# Altium schematic symbol library IC.SchLib: 555 symbols (part 8 of 15) (continued)
## MT47H128M16 (continued)

## MT47H128M16HG-3
designator U?, comment MT47H128M16HG
2Gb Synchronous High-Speed CMOS DRAM, 128Mb x 16Bit x 16 Banks, 84-Ball FPGA, Commercial; Manufacturer: Micron; Manufacturer No: MT47H128M16HG-3:A, MT47H128M16HG-25:A, MT47H128M16RT-25E:C; Sort: 510; Tech: SMDR; Package: BGA84
footprint FBGA84DDR2 (BGA, 84-Leads, Body 14,0x11,5mm,  Pitch 0,80mm)
pins: A1 VDD (power) "Power Supply", A2 NC (in), A3 VSS (power) "Ground", A7 VSSQ (power) "DQ Ground", A8 ~{UDQS} (in) "Data Strobe for DQ8-DQ15", A9 VDDQ (power) "DQ Power", B1 DQ14 (io) "Data Input/Output 14", B2 VSSQ (power) "DQ Ground", B3 UDM (in) "Input/Output Mask for DQ8-DQ15", B7 UDQS (in) "Data Strobe for DQ8-DQ15", B8 VSSQ (power) "DQ Ground", B9 DQ15 (io) "Data Input/Output 15", C1 VDDQ (power) "DQ Power", C2 DQ9 (io) "Data Input/Output 9", C3 VDDQ (power) "DQ Power", C7 VDDQ (power) "DQ Power", C8 DQ8 (io) "Data Input/Output 8", C9 VDDQ (power) "DQ Power", D1 DQ12 (io) "Data Input/Output 12", D2 VSSQ (power) "DQ Ground", D3 DQ11 (io) "Data Input/Output 11", D7 DQ10 (io) "Data Input/Output 10", D8 VSSQ (power) "DQ Ground", D9 DQ13 (io) "Data Input/Output 13", E1 VDD (power) "Power Supply", E2 NC (in), E3 VSS (power) "Ground", E7 VSSQ (power) "DQ Ground", E8 ~{LDQS} (in) "Data Strobe for DQ0-DQ7", E9 VDDQ (power) "DQ Power", F1 DQ6 (io) "Data Input/Output 6", F2 VSSQ (power) "DQ Ground", F3 LDM (in) "Input/Output Mask for DQ0-DQ7", F7 LDQS (in) "Data Strobe for DQ0-DQ7", F8 VSSQ (power) "DQ Ground", F9 DQ7 (io) "Data Input/Output 7", G1 VDDQ (power) "DQ Power", G2 DQ1 (io) "Data Input/Output 1", G3 VDDQ (power) "DQ Power", G7 VDDQ (power) "DQ Power", G8 DQ0 (io) "Data Input/Output 0", G9 VDDQ (power) "DQ Power", H1 DQ4 (io) "Data Input/Output 4", H2 VSSQ (power) "DQ Ground", H3 DQ3 (io) "Data Input/Output 3", H7 DQ2 (io) "Data Input/Output 2", H8 VSSQ (power) "DQ Ground", H9 DQ5 (io) "Data Input/Output 5", J1 VDDL (power) "DL Power", J2 VREF (power) "Vref", J3 VSS (power) "Ground", J7 VSSDL (power) "DL Ground", J8 CK (in) "Clock", J9 VDD (power) "Power Supply", K2 CKE (in) "Clock Enable", K3 ~{WE} (in) "Command Input", K7 ~{RAS} (in) "Command Input", K8 ~{CK} (in) "Clock", K9 ODT (in), L1 BA2 (in), L2 BA0 (in) "Bank Address Input 0", L3 BA1 (in) "Bank Address Input 1", L7 ~{CAS} (in) "Command Input", L8 ~{CS} (in) "Chip Select", M2 A10/AP (in) "Address Input 10", M3 A1 (in) "Address Input 1", M7 A2 (in) "Address Input 2", M8 A0 (in) "Address Input 0", M9 VDD (power) "Power Supply", N1 VSS (power) "Ground", N2 A3 (in) "Address Input 3", N3 A5 (in) "Address Input 5", N7 A6 (in) "Address Input 6", N8 A4 (in) "Address Input 4", P2 A7 (in) "Address Input 7", P3 A9 (in) "Address Input 9", P7 A11 (in) "Address Input 11", P8 A8 (in) "Address Input 8", P9 VSS (power) "Ground", R1 VDD (power) "Power Supply", R2 A12 (in) "Address Input 12", R3 A14 (in), R7 A15 (in), R8 A13 (in)

## NB4N527S
designator U?
3.3V, 2.5Gb/s Dual  AnyLevel to LVDS  Receiver/Driver/Buffer/  Translator with Internal  Input Termination; Manufacturer: OnSemi, Digi-Key; Manufacturer No: NB4N527SMNG, NB4N527SMNGOS-ND; Comment2: +3.3Vcc; Sort: 510; Tech: SMDR; Package: QFN16; Price: 0
footprint QFN16N-2 (QFN, 16-Leads, Body 3,0x3,0mm (max), Pitch 0,50mm, IPC Medium Density)
signal-integrity model Model Name (Model Description)
pins: 1 Vtd1, 2 D1, 3 ~{D1}, 4 ~{Vtd1}, 5 GND, 6 NC, 7 NC, 8 VCC, 9 ~{Q1}, 10 Q1, 11 ~{Q0}, 12 Q0, 13 Vtd0, 14 D0, 15 ~{D0}, 16 ~{Vtd0}, 17 EPAD

## NB6L72M
designator U?
Differential 2 X 2  Crosspoint Switch with  LVPECL Outputs; 2.5V/3.3V; Manufacturer: ON Semiconductor; Manufacturer No: NB6L72MNG; Sort: 510; Tech: SMDR; Package: QFN16; Price: 0
footprint QFN16N-2 (QFN, 16-Leads, Body 3,0x3,0mm (max), Pitch 0,50mm, IPC Medium Density)
pins: 1 SEL0 (in), 2 D0 (in), 3 ~{D0} (in), 4 VTD0, 5 VTD1, 6 D1 (in), 7 ~{D1} (in), 8 SEL1 (in), 9 GND (power), 10 ~{Q1} (out), 11 Q1 (out), 12 VCC (power), 13 VCC (power), 14 ~{Q0} (out), 15 Q0 (out), 16 GND (power), 17 GNDEP (power)

## NCP1117DT18G
designator U?
Low drop regulator 1.8V 0.8 DPAK; Manufacturer: Texas Instruments; Sort: 510; Tech: SMDR; Manufacturer No: NCP1117DT18G; Package: DPAK; Price: 0
footprint DPAK
pins: 1 GND (power), 2 OUT (power), 3 IN (power)

## NUP4201DR2
designator U?
Low Capacitance Diode TVS array 500W Peak Power 6V; Manufacturer: OM Semiconductor; Manufacturer No: NUP4201DR2G; Sort: 510; Tech: SMDR; Comment2: 6V; Package: SOIC8; Price: 0
footprint SOIC8-1
pins: 1 IO1 (io), 2 REF1 (power), 3 REF2 (power), 4 IO2 (io), 5 REF2 (power), 6 IO3 (io), 7 IO4 (io), 8 REF2 (power)

## NUP4201MR6
designator U?
Low Capacitance TSOP-6 Diode-TVS Array for High Speed Data Lines Protection; Manufacturer: OM Semiconductor; Manufacturer No: NUP4201MR6T1G; Sort: 510; Tech: SMDR; Package: TSOP6; Price: 0
footprint SOT23-6
pins: 1 IO (io), 2 Vn (power), 3 IO (io), 4 IO (io), 5 Vp (power), 6 IO (io)

## OC-TLP113
designator U?, comment TLP113
Single Channel, High Speed Optocoupler; Manufacturer: Toshiba; Comment2: 5V 1Mb; Sort: 510; Tech: SMDR; Manufacturer No: TLP113; Package: Optoc SOP6; Price: 0
footprint OCSOP6-1 (SOP 6pin  Optocoupler R1.27mm  10.5x4.4mm)
pins: 1 A, 3 C, 4 GND (power), 5 OUT, 6 VCC (power)

## OC-TLP281
designator U?, comment TLP281
Single Channel, High Speed Optocoupler; Manufacturer: Toshiba; Sort: 510; Tech: SMDR; Manufacturer No: TLP281; Package: Optoc SOP4; Price: 0
footprint OCSOP4-1 (SOP 4pin  Optocoupler R1.27mm  10.5x4.4mm)
pins: 1 A, 2 C, 3 E, 4 C

## OC-TLP281-4
designator U?, comment TLP281-4
Single Channel, High Speed Optocoupler; Manufacturer: Toshiba; Sort: 510; Tech: SMDR; Manufacturer No: TLP281-4; Package: Optoc SOP16; Price: 0
footprint OCSOP16-1 (SOP 16pin  Optocoupler R1.27mm  10.5x4.4mm)
pins: 1 A, 2 C, 3 A, 4 C, 5 A, 6 C, 7 A, 8 C, 9 E, 10 C, 11 E, 12 C, 13 E, 14 C, 15 E, 16 C

## OPA340NA
designator U?
Operational amplifier dual; Manufacturer: Texas; Sort: 510; Tech: SMDR; Manufacturer No: OPA340NA; Package: SOT23-5; Price: 0
footprint SOT23-5
pins: 1 OUT (out), 2 -V (power), 3 + (in), 4 - (in), 5 +V (power)

## OPA547FKTWT
designator U?
Operational amplifier, High voltage/current; Manufacturer: Texas, Digikey; Manufacturer No: OPA547FKTWT, 1648714; Comment2: 8..60Vcc 500mAout 6V/us; Sort: 520; Tech: SMDR; Package: DDPAK-7; Price: 11.2
footprint DDPAK-7
pins: 1 +IN (in), 2 -IN (in), 3 Ilim, 4 -Vs (power), 5 +Vs (power), 6 OUT (out), 7 E/S
text: Vin-; V+; Vin+; V-

## OPA547T-1
designator U?
Operational amplifier, High voltage/current; Manufacturer: Texas, Digikey; Manufacturer No: OPA547T-1, 296-25296-5-ND; Comment2: 8..60Vcc 500mAout 6V/us; Sort: 520; Tech: SMDR; Package: To220-7; Price: 16
footprint TO220-7H1 (TO-220 horizontal 7pin)
pins: 1 +IN (in), 2 -IN (in), 3 Ilim, 4 -Vs (power), 5 +Vs (power), 6 OUT (out), 7 E/S
text: Vin-; V+; Vin+; V-

## OPA695
designator U?
Ultra-Wideband, Current-Feedback Operational Amplifier with Disable; Manufacturer: Texas Instruments; Manufacturer No: OPA695IDBVTG4; Sort: 510; Tech: SMDR; Package: SOT23-6; Price: 0
footprint SOT23-6
pins: 1 OUT, 2 -Vs, 3 IN+, 4 IN-, 5 ~{DIS}, 6 +Vs

## OPA847
designator U?
Wideband, Ultra-Low Noise, Voltage-Feedback  OPERATIONAL AMPLIFIER with Shutdown; Manufacturer: Texas Instruments; Manufacturer No: OPA847IDBVT; Sort: 510; Tech: SMDR; Package: SOT23-6; Price: 0
footprint SOT23-6
pins: 1 OUT (out), 2 -V (power), 3 + (in), 4 - (in), 5 ~{DIS} (power), 6 +V (power)
text: DIS#

## OPA2340UA
designator U?
Operational amplifier dual; Manufacturer: Texas; Sort: 510; Tech: SMDR; Manufacturer No: OPA2340UA; Package: SOIC8; Price: 0
footprint SOIC8-1
part A pins: 1 OUT (out), 2 - (in), 3 + (in), 4 -V (power), 8 +V (power)
part B pins: 5 + (in), 6 - (in), 7 OUT (out)

## OPA4171AIPWR
designator U?, comment OPA4171AI
Quad Low Offset operational amplifier; Manufacturer: Texas, Farnell; Manufacturer No: OPA4171AIPWR, 2064254; Sort: 510; Tech: SMDR; Package: TSSOP14; Price: 2.4
footprint TSSOP14 (TSSOP14 5x4.4mm R0.65mm)
part A pins: 1 OUTA (out), 2 -A (in), 3 +A (in)
part B pins: 5 +B (in), 6 -B (in), 7 OUTB (out)
part C pins: 8 OUTC (out), 9 -C (in), 10 +C (in)
part D pins: 12 +D (in), 13 -D (in), 14 OUTD (out)
part E pins: 4 +V (power), 11 -V (power)

## OPA4376AIPWR
designator U?, comment OPA4376
Quad Low Offset operational amplifier; Manufacturer: Texas, Farnell; Manufacturer No: OPA4376AIPWR, 1575197; Sort: 510; Tech: SMDR; Package: TSSOP14; Price: 3.5
footprint TSSOP14 (TSSOP14 5x4.4mm R0.65mm)
part A pins: 1 OUTA (out), 2 -A (in), 3 +A (in), 4 +V (power), 11 -V (power)
part B pins: 5 +B (in), 6 -B (in), 7 OUTB (out)
part C pins: 8 OUTC (out), 9 -C (in), 10 +C (in)
part D pins: 12 +D (in), 13 -D (in), 14 OUTD (out)
part A text: V+; V-

## OSC-10MHZ1PPM
designator OSC?, comment 10MHz 1ppm
TCVCXO oscillator 10MHz 1ppm; Manufacturer: RAKON, Farnell; Manufacturer No: LF TVXO009912, 1100747; Sort: 520; Tech: SMDR; Package: Oscillator CFPT-126; Price: 0
signal-integrity model Model Name (Model Description)
footprint CFPT-126 (Ceramic oscillator 7x5x2mm SMD)
pins: 1 VC (in), 2 GND (power), 3 OUT (out), 4 +VS (power)

## OSC-25MHZ50PPM
designator OSC?, comment 25MHz 50ppm
Crystal oscillator 25MHz  50ppm; Sort: 520; Tech: SMDR; Comment2: 25MHz 50ppm; Price: 0
signal-integrity model Model Name (Model Description)
footprint SMD6x3.5 (Cristal oscillator 6x3.5x1.4mm SMD)
pins: 1 EN, 2 GND (power), 3 OUT (out), 4 +VS (power)

## OSC-27MHZ1.5PPM
designator OSC?, comment XO-Si530-27MHz
Crystal oscillator LVPECL out 27MHz 1.5ppm; Manufacturer: Silicon Labs; Manufacturer No: 530AA27M0000DG; Comment2: 27MHz; 3.3V; Sort: 520; Tech: SMDR; Package: OSC 5x7 6pin; Price: 0
signal-integrity model Model Name (Model Description)
footprint OSC5X7-61 (Crystal oscillator 5x7x1.65mm 6pin)
pins: 1 NC, 2 OE (in), 3 GND (power), 4 CLK (out), 5 ~{CLK} (out), 6 VDD (power)

## OSC-50MHZ50PPM
designator OSC?, comment 50MHz 50ppm
Crystal oscillator 50MHz  50ppm; Manufacturer: C-MAC; Manufacturer No: LF SPXO018044; Sort: 520; Tech: SMDR; Price: 0
signal-integrity model Model Name (Model Description)
footprint CFPS-73 (Ceramic oscillator 7x5x1.8mm SMD)
pins: 1 EN, 2 GND (power), 3 OUT (out), 4 +VS (power)

## OSC-CLV1630ALF
designator OSC?, comment CLV1630ALF
VCO oscillator 1593-1654MHz 0.5-4.5V; Manufacturer: Z-communications; Comment2: 5V, 24mA; Sort: 520; Tech: SMDR; Manufacturer No: CLV1630ALF; Package: MINI-16-L 0.5x0.5x0.13"; Price: 0
signal-integrity model Model Name (Model Description)
footprint SQ500-2 (VCO hybrid 0.5" square 16 pin Z-Comm.)
pins: 1 GND (power), 2 RFout (out), 3 GND (power), 4 GND (power), 5 GND (power), 6 Vcc (power), 7 GND (power), 8 GND (power), 9 GND (power), 10 Vt (in), 11 GND (power), 12 GND (power), 13 GND (power), 14 GND (power), 15 GND (power), 16 GND (power)
text: VCO

## OSC-CLV6580ALF
designator OSC?, comment CLV6580ALF
VCO oscillator 6390-6770MHz 0.5-8V; Manufacturer: Z-communications; Comment2: 8V, 25mA; Sort: 520; Tech: SMDR; Manufacturer No: CLV6580ALF; Package: MINI-16HT 0.5x0.5x0.205"; Price: 0
signal-integrity model Model Name (Model Description)
footprint SQ500-2 (VCO hybrid 0.5" square 16 pin Z-Comm.)
pins: 1 GND (power), 2 RFout (out), 3 GND (power), 4 GND (power), 5 GND (power), 6 Vcc (power), 7 GND (power), 8 GND (power), 9 GND (power), 10 Vt (in), 11 GND (power), 12 GND (power), 13 GND (power), 14 GND (power), 15 GND (power), 16 GND (power)
text: VCO

## OSC-CVCO55CCQ-2400-2400
designator OSC?, comment CVCO55CCQ-2400-2400
Coaxial Resonator Oscillator-CRO; Manufacturer: Crystek; Comment2: 2400MHz, 5Vcc, 0.3-4.7Vtune; Sort: 520; Tech: SMDR; Manufacturer No: CVCO55CCQ-2400-2400; Package: SQ0.50"SMD16; Price: 0
signal-integrity model Model Name (Model Description)
footprint SQ500-1 (VCO hybrid 0.5" square 16 pin)
pins: 1 GND (power), 2 VT (in), 3 GND (power), 4 GND (power), 5 GND (power), 6 GND (power), 7 GND (power), 8 GND (power), 9 GND (power), 10 RFOUT (out), 11 GND (power), 12 GND (power), 13 GND (power), 14 +VS (power), 15 GND (power), 16 GND (power)
text: VCO

## OSC-DFN S11-ELCPI1
designator OSC?, comment DFN S11-ELCPI 62.5M XB25
VCSO oscillator, dual frequency; Manufacturer: Fordahl; Comment2: XO 62.5MHz; 3.3V; XB25; Sort: 520; Tech: SMDR; Manufacturer No: DFN S11-ELCPI 62.5M XB25; Package: 5x7.5x1.7mm; Price: 0
signal-integrity model Model Name (Model Description)
footprint OSC-DFN S11-ELCPI (Oscillator ceramic 5x7.5x1.7mm)
pins: 1 E/~{D} (in), 2 NC (in), 3 GND (power), 4 OUT1 (out), 5 OUT2 (out), 6 VCC (power)

## OSC-EX-420-??
designator OSC?, comment EX-420
OCXO oscillator DIP; Manufacturer: Vectron; Manufacturer No: EX-420 ???; Comment2: ???MHz ?ppb +?Vcc; Sort: 520; Tech: THTH; Package: OSC 4pin DIP; Price: 0
signal-integrity model Model Name (Model Description)
footprint OSC-DIL8-1 (Oscillator dip 4pin 13.2x13.2x7.6mm)
pins: 1 EFC (in), 4 GND (power), 5 RF OUT (out), 8 VCC (power)

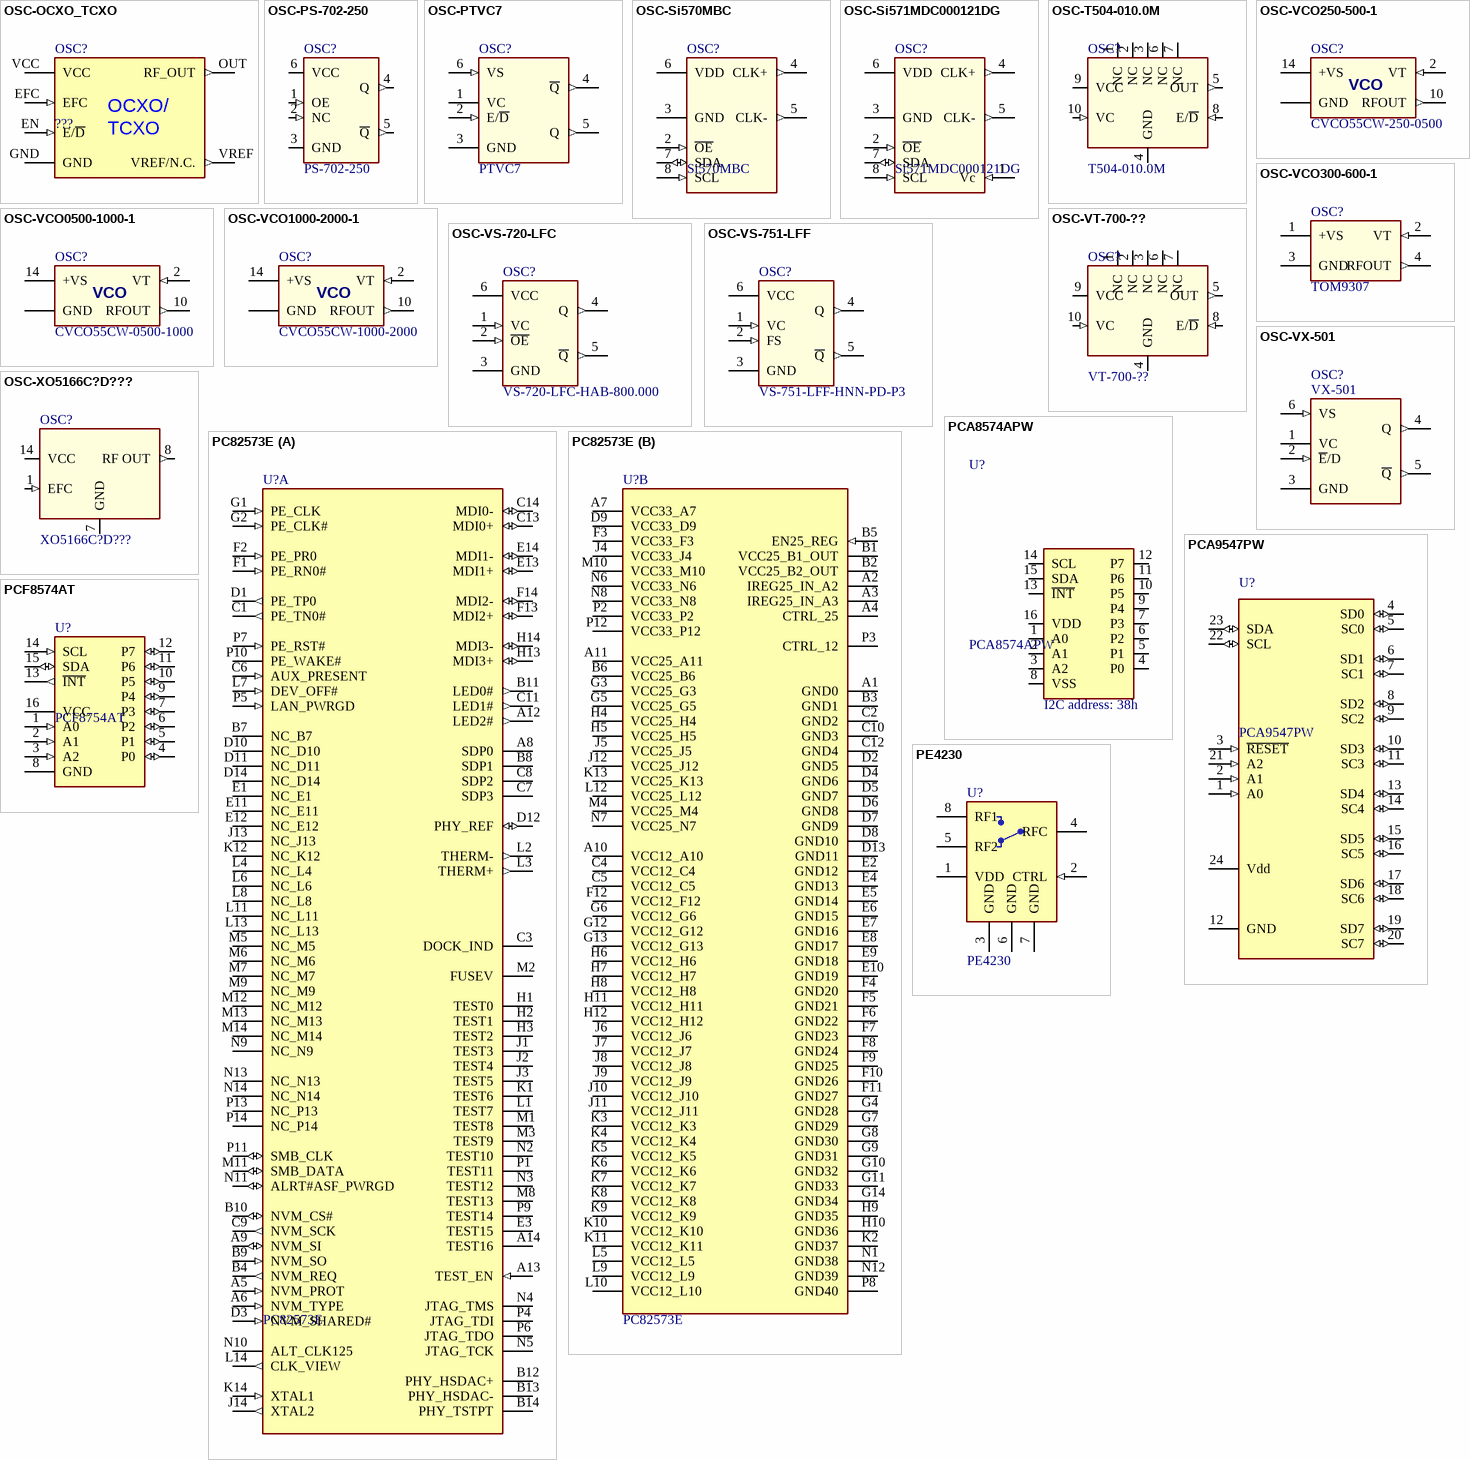
[diagram p34: symbols OSC-OCXO_TCXO to PE4230]

## OSC-OCXO_TCXO
designator OSC?, comment ???
Oven CXO / TCXO; Sort: 520; Tech: THDM; Price: 0
signal-integrity model Model Name (Model Description)
footprint OCXO_TCXO (Grouped OCXO and TCXO footprint)
pins: EFC (in) "Electronic  Frequency Tuning/Do not connect if EFC is not used.", EN E/~{D} (in) "Connect to VCC.", GND (power) "Ground (case).", OUT RF_OUT (out) "RF Output.", VCC (power) "Supply voltage input.", VREF VREF/N.C. (out) "Do not connect!"
text: OCXO/; TCXO

## OSC-PS-702-250
designator OSC?, comment PS-702-250
XO oscillator; Manufacturer: Vectron; Manufacturer No: PS-702-ECE-KAAN-250M000000; Comment2: 250.0000MHz; 3.3V; Sort: 520; Tech: SMDR; Package: 5x7.5x2mm; Price: 0
signal-integrity model Model Name (Model Description)
footprint OSC-VS-702 (Oscillator ceramic leadless 5x7.5x2mm)
pins: 1 OE (in), 2 NC (in), 3 GND (power), 4 Q (out), 5 ~{Q} (out), 6 VCC (power)

## OSC-PTVC7
designator OSC?, comment PTVC7
VCXO oscillator; Manufacturer: FOQ; Manufacturer No: TBD; Sort: 520; Tech: SMDR; Package: OSC PTVC7 6pin SMD; Price: 0
signal-integrity model Model Name (Model Description)
footprint OSC-PTVC7 (Oscilator 14.4x9.5mm 6 pin)
pins: 1 VC (power), 2 E/~{D} (in), 3 GND (power), 4 ~{Q} (out), 5 Q (out), 6 VS (in)

## OSC-Si570MBC
designator OSC?, comment Si570MBC
XO I2C programmable oscillator; Manufacturer: Silicon Labs; Manufacturer No: Si570MBC000121DG; Comment2: 10..280MHz 3.3Vcc LVPECLout 20ppm; Sort: 580; Tech: SMDR; Package: 7X5x1.7mm; Price: 25
signal-integrity model Model Name (Model Description)
footprint OSC5X7-8 (Crystal oscillator 5x7x1.65mm 8pin)
pins: 2 ~{OE} (in), 3 GND (power), 4 CLK+ (out), 5 CLK- (out), 6 VDD (power), 7 SDA (io), 8 SCL (in)

## OSC-Si571MDC000121DG
designator OSC?, comment Si571MDC000121DG
VCXO I2C programmable oscillator; Manufacturer: Silicon Labs; Comment2: 10..280MHz 3.3Vcc LVPECLout 20ppm; Sort: 580; Tech: SMDR; Manufacturer No: Si571MDC000121DG; Package: 7X5x1.7mm; Price: 25
signal-integrity model Model Name (Model Description)
footprint OSC5X7-8 (Crystal oscillator 5x7x1.65mm 8pin)
pins: 1 Vc (in), 2 ~{OE} (in), 3 GND (power), 4 CLK+ (out), 5 CLK- (out), 6 VDD (power), 7 SDA (io), 8 SCL (in)

## OSC-T504-010.0M
designator OSC?, comment T504-010.0M
TCVCXO oscillator 5x7mm; Manufacturer: Connor Winfield; Comment2: 10.0MHz 0.28ppm +3.3Vcc; Sort: 520; Tech: SMDR; Manufacturer No: T504-010.0M; Package: OSC 5x7mm 10pin; Price: 0
signal-integrity model Model Name (Model Description)
footprint OSC-TCVCXO5X7-10 (Oscillator ceramic leadless 5x7x2mm)
pins: 1 NC, 2 NC, 3 NC, 4 GND (power), 5 OUT (out), 6 NC, 7 NC, 8 E/~{D} (in), 9 VCC (power), 10 VC (in)

## OSC-VCO250-500-1
designator OSC?, comment CVCO55CW-250-0500
VCO oscillator 250-500MHz 15V 25mA; Manufacturer: Crystek; Sort: 520; Tech: SMDR; Manufacturer No: CVCO55CW-250-0500; Package: SQ0.50"SMD16; Price: 0
signal-integrity model Model Name (Model Description)
footprint SQ500-1 (VCO hybrid 0.5" square 16 pin)
pins: 1 GND (power), 2 VT (in), 3 GND (power), 4 GND (power), 5 GND (power), 6 GND (power), 7 GND (power), 8 GND (power), 9 GND (power), 10 RFOUT (out), 11 GND (power), 12 GND (power), 13 GND (power), 14 +VS (power), 15 GND (power), 16 GND (power)
text: VCO

## OSC-VCO300-600-1
designator OSC?, comment TOM9307
VCO oscillator 300-600MHz 15V 30mA; Manufacturer: Amplifox; Sort: 520; Tech: SMDR; Manufacturer No: TOM9307; Package: TO-8 (T4); Price: 0
signal-integrity model Model Name (Model Description)
footprint TO-8-T4 (TO-8 4pin metal)
pins: 1 +VS (power), 2 VT (in), 3 GND (power), 4 RFOUT (out)

## OSC-VCO0500-1000-1
designator OSC?, comment CVCO55CW-0500-1000
VCO oscillator 0500-1000 MHz 18V 25mA; Manufacturer: Crystek; Sort: 520; Tech: SMDR; Manufacturer No: CVCO55CW-0500-1000; Package: SQ0.50"SMD16; Price: 0
signal-integrity model Model Name (Model Description)
footprint SQ500-1 (VCO hybrid 0.5" square 16 pin)
pins: 1 GND (power), 2 VT (in), 3 GND (power), 4 GND (power), 5 GND (power), 6 GND (power), 7 GND (power), 8 GND (power), 9 GND (power), 10 RFOUT (out), 11 GND (power), 12 GND (power), 13 GND (power), 14 +VS (power), 15 GND (power), 16 GND (power)
text: VCO

## OSC-VCO1000-2000-1
designator OSC?, comment CVCO55CW-1000-2000
VCO oscillator 1000-2000 MHz 20V 25mA; Manufacturer: Crystek; Sort: 520; Tech: SMDR; Manufacturer No: CVCO55CW-1000-2000; Package: SQ0.50"SMD16; Price: 0
signal-integrity model Model Name (Model Description)
footprint SQ500-1 (VCO hybrid 0.5" square 16 pin)
pins: 1 GND (power), 2 VT (in), 3 GND (power), 4 GND (power), 5 GND (power), 6 GND (power), 7 GND (power), 8 GND (power), 9 GND (power), 10 RFOUT (out), 11 GND (power), 12 GND (power), 13 GND (power), 14 +VS (power), 15 GND (power), 16 GND (power)
text: VCO

## OSC-VS-720-LFC
designator OSC?, comment VS-720-LFC-HAB-800.000
VCSO oscillator; Manufacturer: Vectron; Comment2: 800.0000MHz; 3.3V; Sort: 520; Tech: SMDR; Manufacturer No: VS-720-LFC-HAB-800.000; Package: 5x7.5x2mm; Price: 0
signal-integrity model Model Name (Model Description)
footprint OSC-VS-720 (Oscillator ceramic leadless 5x7.5x2mm)
pins: 1 VC (in), 2 ~{OE} (in), 3 GND (power), 4 Q (out), 5 ~{Q} (out), 6 VCC (power)

## OSC-VS-751-LFF
designator OSC?, comment VS-751-LFF-HNN-PD-P3
VCSO oscillator, dual frequency; Manufacturer: Vectron; Comment2: 624.6938/ 625.0000MHz; 3.3V; Sort: 520; Tech: SMDR; Manufacturer No: VS-751-LFF-HNN-PD-P3; Package: 5x7.5x2.5mm; Price: 0
signal-integrity model Model Name (Model Description)
footprint OSC-VS-751 (Oscillator ceramic leadless 5x7.5x2.5mm)
pins: 1 VC (in), 2 FS (in), 3 GND (power), 4 Q (out), 5 ~{Q} (out), 6 VCC (power)

## OSC-VT-700-??
designator OSC?, comment VT-700-??
TCVCXO oscillator 5x7mm; Manufacturer: Vectron; Comment2: ???MHz 0.28ppm +3.3Vcc; Sort: 520; Tech: SMDR; Manufacturer No: VT-700-??; Package: OSC 5x7mm 10pin; Price: 0
signal-integrity model Model Name (Model Description)
footprint OSC-TCVCXO5X7-10 (Oscillator ceramic leadless 5x7x2mm)
pins: 1 NC, 2 NC, 3 NC, 4 GND (power), 5 OUT (out), 6 NC, 7 NC, 8 E/~{D} (in), 9 VCC (power), 10 VC (in)

## OSC-VX-501
designator OSC?, comment VX-501
Vectron VCXO oscillator; Manufacturer No: VX-501 1 – ECJ – 105 1 – 155M000000; Comment2: Enable low; Sort: 520; Tech: SMDR; Manufacturer: VECTRON; Package: G218B; Price: 0
signal-integrity model Model Name (Model Description)
footprint OSC-PTVC7 (Oscilator 14.4x9.5mm 6 pin)
pins: 1 VC (power), 2 ~{E}/D (in), 3 GND (power), 4 Q (out), 5 ~{Q} (out), 6 VS (in)

## OSC-XO5166C?D???
designator OSC?, comment XO5166C?D???
OCXO oscillator DIP; Manufacturer: MtronPTI; Comment2: ???MHz ?ppb +3.3Vcc; Sort: 520; Tech: THTH; Manufacturer No: XO5166C?D???; Package: OSC 14pin DIP; Price: 0
signal-integrity model Model Name (Model Description)
footprint OSC-DIL14-1 (Oscillator dip 14 4pin 20.2x13.2x7.6mm)
pins: 1 EFC (in), 7 GND (power), 8 RF OUT (out), 14 VCC (power)

## PC82573E
designator U?
PCIe* GbE Controller; Manufacturer: Intel; Sort: 510; Tech: SMDR; Manufacturer No: PC82573E; Package: TF-BGA196; Price: 0
footprint BGA196
part A pins: A5 NVM_PROT (in), A6 NVM_TYPE (in), A8 SDP0, A9 NVM_SI (io), A12 LED2# (out), A13 TEST_EN (in), A14 TEST16, B4 NVM_REQ (out), B7 NC_B7, B8 SDP1, B9 NVM_SO (in), B10 NVM_CS# (io), B11 LED0# (out), B12 PHY_HSDAC+, B13 PHY_HSDAC-, B14 PHY_TSTPT, C1 PE_TN0# (out), C3 DOCK_IND, C6 AUX_PRESENT (in), C7 SDP3, C8 SDP2, C9 NVM_SCK (out), C11 LED1# (out), C13 MDI0+ (io), C14 MDI0- (io), D1 PE_TP0 (out), D3 NVM_SHARED# (in), D10 NC_D10, D11 NC_D11, D12 PHY_REF (io), D14 NC_D14, E1 NC_E1, E3 TEST15, E11 NC_E11, E12 NC_E12, E13 MDI1+ (io), E14 MDI1- (io), F1 PE_RN0# (in), F2 PE_PR0 (in), F13 MDI2+ (io), F14 MDI2- (io), G1 PE_CLK (in), G2 PE_CLK# (in), H1 TEST0, H2 TEST1, H3 TEST2, H13 MDI3+ (io), H14 MDI3- (io), J1 TEST3, J2 TEST4, J3 TEST5, J13 NC_J13, J14 XTAL2 (out), K1 TEST6, K12 NC_K12, K14 XTAL1 (in), L1 TEST7, L2 THERM- (out), L3 THERM+ (out), L4 NC_L4, L6 NC_L6, L7 DEV_OFF# (in), L8 NC_L8, L11 NC_L11, L13 NC_L13, L14 CLK_VIEW (out), M1 TEST8, M2 FUSEV (power), M3 TEST9, M5 NC_M5, M6 NC_M6, M7 NC_M7, M8 TEST13, M9 NC_M9, M11 SMB_DATA (io), M12 NC_M12, M13 NC_M13, M14 NC_M14, N2 TEST10, N3 TEST12, N4 JTAG_TMS, N5 JTAG_TCK, N9 NC_N9, N10 ALT_CLK125, N11 ALRT#ASF_PWRGD (io), N13 NC_N13, N14 NC_N14, P1 TEST11, P4 JTAG_TDI, P5 LAN_PWRGD (in), P6 JTAG_TDO, P7 PE_RST# (in), P9 TEST14, P10 PE_WAKE# (oc), P11 SMB_CLK (io), P13 NC_P13, P14 NC_P14
part B pins: A1 GND0 (power), A2 IREG25_IN_A2 (power), A3 IREG25_IN_A3 (power), A4 CTRL_25 (power), A7 VCC33_A7 (power), A10 VCC12_A10 (power), A11 VCC25_A11 (power), B1 VCC25_B1_OUT (power), B2 VCC25_B2_OUT (power), B3 GND1 (power), B5 EN25_REG (in), B6 VCC25_B6 (power), C2 GND2 (power), C4 VCC12_C4 (power), C5 VCC12_C5 (power), C10 GND3 (power), C12 GND4 (power), D2 GND5 (power), D4 GND6 (power), D5 GND7 (power), D6 GND8 (power), D7 GND9 (power), D8 GND10 (power), D9 VCC33_D9 (power), D13 GND11 (power), E2 GND12 (power), E4 GND13 (power), E5 GND14 (power), E6 GND15 (power), E7 GND16 (power), E8 GND17 (power), E9 GND18 (power), E10 GND19 (power), F3 VCC33_F3 (power), F4 GND20 (power), F5 GND21 (power), F6 GND22 (power), F7 GND23 (power), F8 GND24 (power), F9 GND25 (power), F10 GND26 (power), F11 GND27 (power), F12 VCC12_F12 (power), G3 VCC25_G3 (power), G4 GND28 (power), G5 VCC25_G5 (power), G6 VCC12_G6 (power), G7 GND29 (power), G8 GND30 (power), G9 GND31 (power), G10 GND32 (power), G11 GND33 (power), G12 VCC12_G12 (power), G13 VCC12_G13 (power), G14 GND34 (power), H4 VCC25_H4 (power), H5 VCC25_H5 (power), H6 VCC12_H6 (power), H7 VCC12_H7 (power), H8 VCC12_H8 (power), H9 GND35 (power), H10 GND36 (power), H11 VCC12_H11 (power), H12 VCC12_H12 (power), J4 VCC33_J4 (power), J5 VCC25_J5 (power), J6 VCC12_J6 (power), J7 VCC12_J7 (power), J8 VCC12_J8 (power), J9 VCC12_J9 (power), J10 VCC12_J10 (power), J11 VCC12_J11 (power), J12 VCC25_J12 (power), K2 GND37 (power), K3 VCC12_K3 (power), K4 VCC12_K4 (power), K5 VCC12_K5 (power), K6 VCC12_K6 (power), K7 VCC12_K7 (power), K8 VCC12_K8 (power), K9 VCC12_K9 (power), K10 VCC12_K10 (power), K11 VCC12_K11 (power), K13 VCC25_K13 (power), L5 VCC12_L5 (power), L9 VCC12_L9 (power), L10 VCC12_L10 (power), L12 VCC25_L12 (power), M4 VCC25_M4 (power), M10 VCC33_M10 (power), N1 GND38 (power), N6 VCC33_N6 (power), N7 VCC25_N7 (power), N8 VCC33_N8 (power), N12 GND39 (power), P2 VCC33_P2 (power), P3 CTRL_12 (power), P8 GND40 (power), P12 VCC33_P12 (power)

## PCA8574APW
designator U?  I2C address: 38h
Remote 8-bit I/O expander for I2C-bus with interrupt; Manufacturer: NXP, Digikey; Manufacturer No: PCA8574APW, 568-4237-5-ND; Comment2: 2.3..5.5Vcc 400KHz; Sort: 510; Tech: SMDR; Price: 2; Value: PCA8574; Package: TSSOP16
footprint TSSOP16 (TSSOP16 5x4.4mm R0.65mm)
pins: 1 A0 "Address Inputs", 2 A1 "Address Inputs", 3 A2 "Address Inputs", 4 P0 "quasi-bidirectional I/O", 5 P1 "quasi-bidirectional I/O", 6 P2 "quasi-bidirectional I/O", 7 P3 "quasi-bidirectional I/O", 8 VSS "suuply ground", 9 P4 "quasi-bidirectional I/O", 10 P5 "quasi-bidirectional I/O", 11 P6 "quasi-bidirectional I/O", 12 P7 "quasi-bidirectional I/O", 13 ~{INT} "interrupt output (active LOW)", 14 SCL "serial clock line", 15 SDA "serial data line", 16 VDD "supply voltage"

## PCA9547PW
designator U?
8 channel I2C bus multiplexer with reset; Manufacturer: NXP; Comment2: 2.3-5.5Vdd; Sort: 510; Tech: SMDR; Manufacturer No: PCA9547PW; Package: TSSOP24; Price: 2
footprint TSSOP24-TI (Plastic Small Outline 24pin R0.65mm 7.8x4.4x1.2mm)
pins: 1 A0 (in), 2 A1 (in), 3 ~{RESET} (in), 4 SD0 (io), 5 SC0 (io), 6 SD1 (io), 7 SC1 (io), 8 SD2 (io), 9 SC2 (io), 10 SD3 (io), 11 SC3 (io), 12 GND (power), 13 SD4 (io), 14 SC4 (io), 15 SD5 (io), 16 SC5 (io), 17 SD6 (io), 18 SC6 (io), 19 SD7 (io), 20 SC7 (io), 21 A2 (in), 22 SCL (io), 23 SDA (io), 24 Vdd (power)

## PCF8574AT
designator U?, comment PCF8754AT
Remote 8bit I/O expander for I2C bus; Manufacturer: NXP; Manufacturer No: PCF8574AT; Comment2: 2.5-6Vcc; h38adr; Sort: 510; Tech: SMDR; Package: SOIC16; Price: 0
signal-integrity model Model Name (Model Description)
footprint SOIC16-1 (Small IC 16 pin)
pins: 1 A0 (in), 2 A1 (in), 3 A2 (in), 4 P0 (io), 5 P1 (io), 6 P2 (io), 7 P3 (io), 8 GND (power), 9 P4 (io), 10 P5 (io), 11 P6 (io), 12 P7 (io), 13 ~{INT} (out), 14 SCL (in), 15 SDA (io), 16 VCC (power)

## PE4230
designator U?
SPDT High Power CMOS RF Switch; SO8; Manufacturer: Peregrine Semiconductor; Manufacturer No: PE4230G-08MSOP-50A; Sort: 510; Tech: SMDR; Package: MSOP08; Price: 0
footprint TSSOP8 (TSSOP8 3x3mm R0.65mm)
pins: 1 VDD (power), 2 CTRL (in), 3 GND (power), 4 RFC (hiz), 5 RF2 (hiz), 6 GND (power), 7 GND (power), 8 RF1 (hiz)

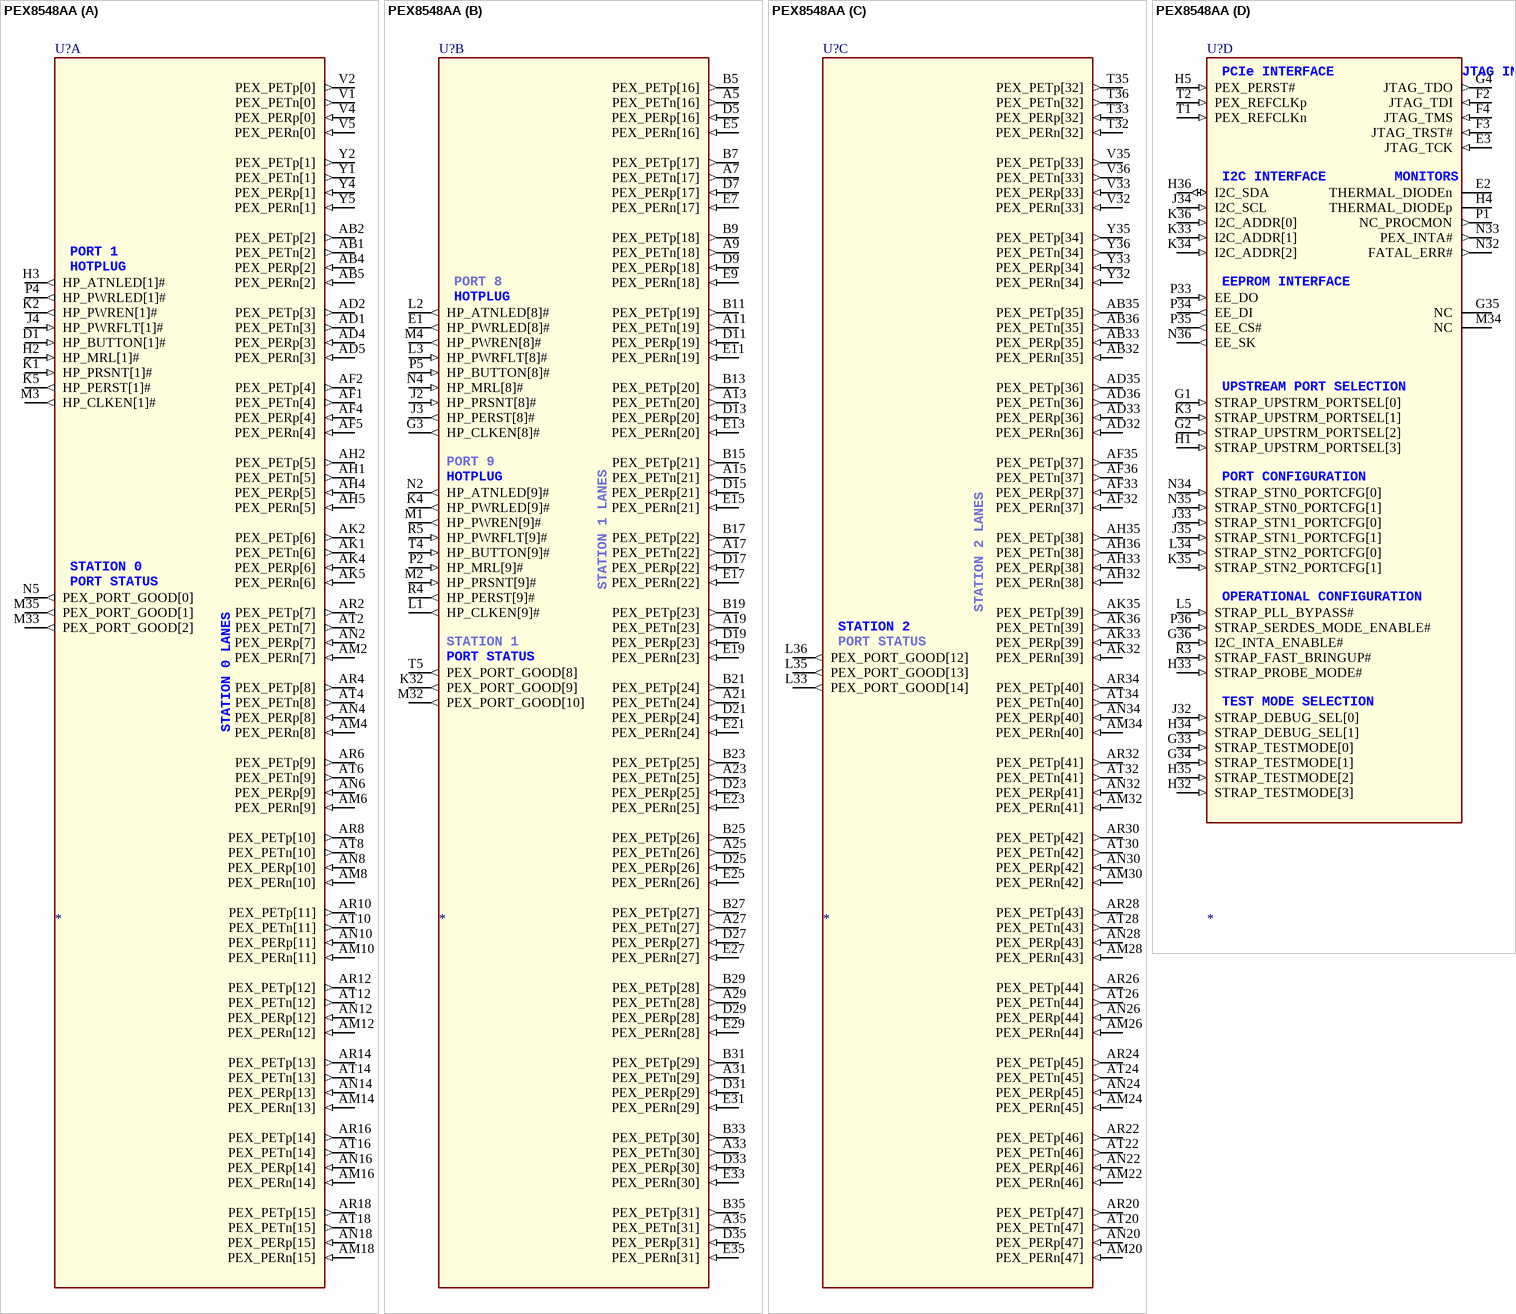
[diagram p35: symbol PEX8548AA]

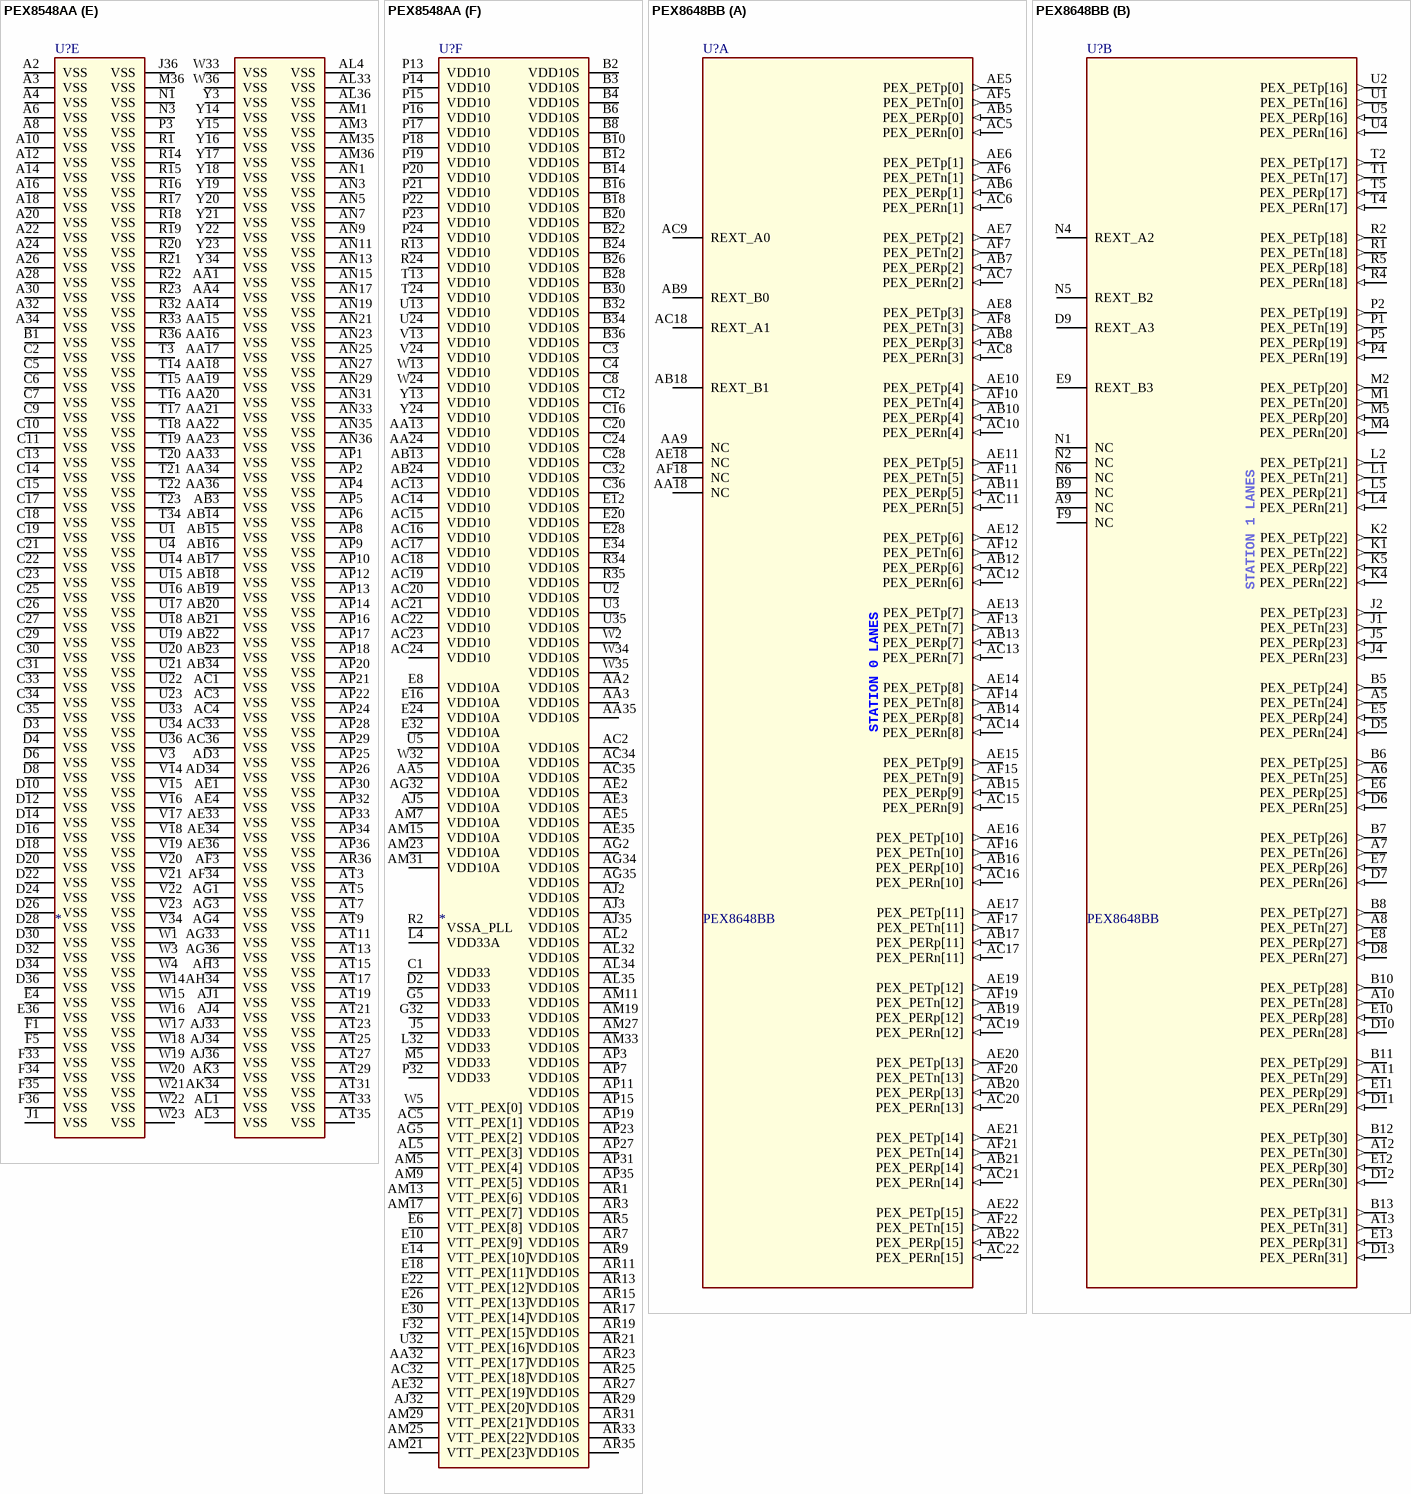
[diagram p36: symbols PEX8548AA to PEX8648BB]